# Altium footprint library DrPCB.PcbLib: 910 footprints (part 5 of 57)
Each footprint in its own frame and in the unit in brackets; x right, y up, seen from the top. Pads: shape width x height; smd on the part's side, far side on the other; paste and mask are expansions set on the pad; w line width, h text height; cw(c..) or ccw(c..) is an arc to the next point about the centre after c.
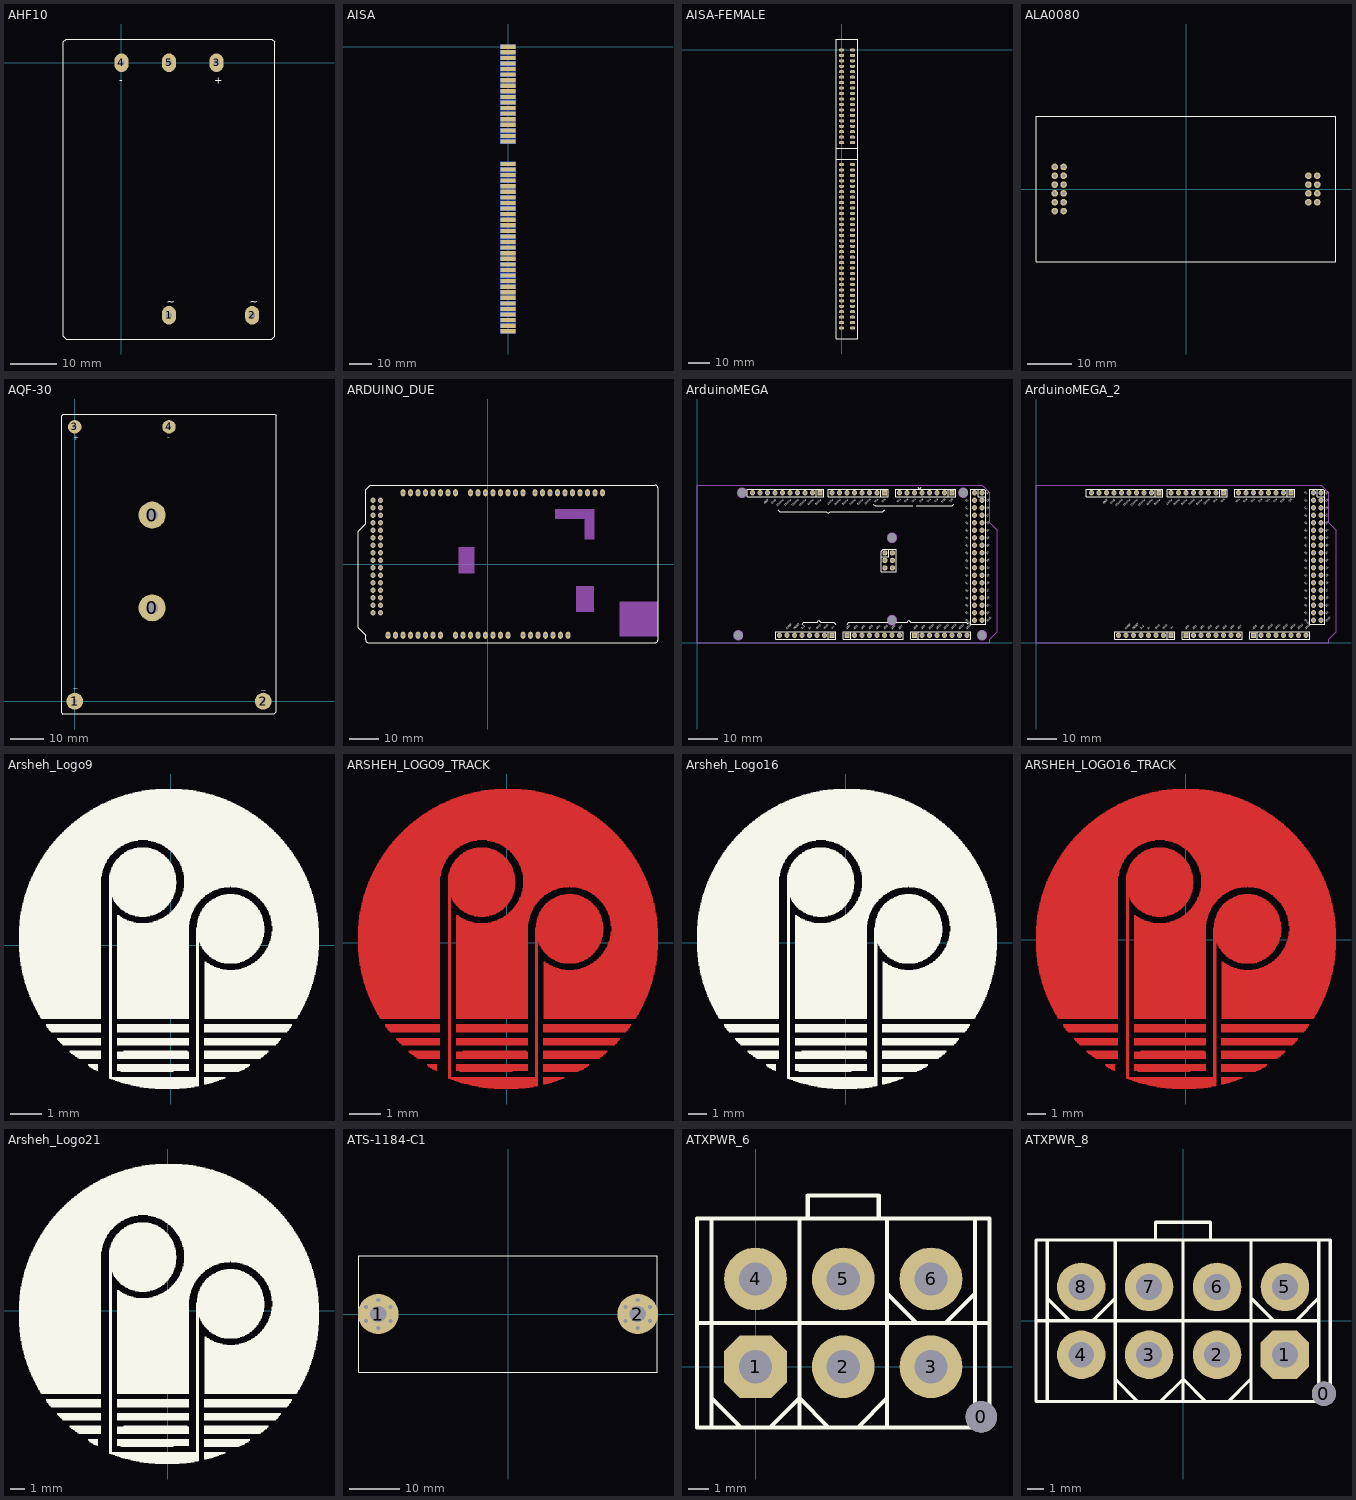
[diagram p4: the footprints below, top view; thin cyan lines are the x and y axes]

## AHF10 [mm]
pads (5):
  oval 3x4 hole 1.254: 1(10.16,-53.975) 2(27.94,-53.975) 3(20.32,0) 4(0,0) 5(10.16,0)
Top Overlay:
  lines w0.254: -12.446,-58.42 -11.811,-59.055 32.131,-59.055 32.766,-58.42 32.766,4.445 32.131,5.08 -11.811,5.08 -12.446,4.445 -12.446,-58.42
  text "~" at 27.432,-51.816 h1.52
  text "~" at 9.652,-51.816 h1.52
  text "+" at 19.812,-4.445 h1.52
  text "-" at -0.508,-4.445 h1.52

## AISA [mm]
pads (98):
  rect 7x1.9 smd far side: 1(-0.04,0.077) 3(-0.04,-2.463) 5(-0.04,-5.003) 7(-0.04,-7.543) 9(-0.04,-10.083) 11(-0.04,-12.623) 13(-0.04,-15.163) 15(-0.04,-17.703) 17(-0.04,-20.243) 19(-0.04,-22.783) 21(-0.04,-25.323) 23(-0.04,-27.863) 25(-0.04,-30.403) 27(-0.04,-32.943) 29(-0.04,-35.483) 31(-0.04,-38.023) 33(-0.04,-40.563) 35(-0.04,-43.103) 37(-0.04,-53.263) 39(-0.033,-55.799) 41(-0.033,-58.339) 43(-0.033,-60.879) 45(-0.033,-63.419) 47(-0.033,-65.959) 49(-0.033,-68.499) 51(-0.033,-71.039) 53(-0.033,-73.579) 55(-0.033,-76.119) 57(-0.033,-78.659) 59(-0.033,-81.199) 61(-0.033,-83.739) 63(-0.033,-86.279) 65(-0.033,-88.819) 67(-0.033,-91.359) 69(-0.033,-93.899) 71(-0.033,-96.439) 73(-0.033,-98.979) 75(-0.033,-101.519) 77(-0.033,-104.059) 79(-0.033,-106.599) 81(-0.033,-109.139) 83(-0.033,-111.679) 85(-0.033,-114.219) 87(-0.033,-116.759) 89(-0.033,-119.299) 91(-0.033,-121.839) 93(-0.033,-124.379) 95(-0.033,-126.919) 97(-0.033,-129.459)
  rect 7x1.9 smd: 2(-0.043,0.089) 4(-0.043,-2.451) 6(-0.043,-4.991) 8(-0.043,-7.531) 10(-0.043,-10.071) 12(-0.043,-12.611) 14(-0.043,-15.151) 16(-0.043,-17.691) 18(-0.043,-20.231) 20(-0.043,-22.771) 22(-0.043,-25.311) 24(-0.043,-27.851) 26(-0.043,-30.391) 28(-0.043,-32.931) 30(-0.043,-35.471) 32(-0.043,-38.011) 34(-0.043,-40.551) 36(-0.043,-43.091) 38(-0.034,-53.264) 40(-0.034,-55.804) 42(-0.034,-58.344) 44(-0.034,-60.884) 46(-0.034,-63.424) 48(-0.034,-65.964) 50(-0.034,-68.504) 52(-0.034,-71.044) 54(-0.034,-73.584) 56(-0.034,-76.124) 58(-0.034,-78.664) 60(-0.034,-81.204) 62(-0.034,-83.744) 64(-0.034,-86.284) 66(-0.034,-88.824) 68(-0.034,-91.364) 70(-0.034,-93.904) 72(-0.034,-96.444) 74(-0.034,-98.984) 76(-0.034,-101.524) 78(-0.034,-104.064) 80(-0.034,-106.604) 82(-0.034,-109.144) 84(-0.034,-111.684) 86(-0.034,-114.224) 88(-0.034,-116.764) 90(-0.034,-119.304) 92(-0.034,-121.844) 94(-0.034,-124.384) 96(-0.034,-126.924) 98(-0.034,-129.464)

## AISA-FEMALE [mm]
pads (98):
  oval 2.5x1.4 hole 1: 1(5.08,0) 2(0,0) 3(5.08,-2.54) 4(0,-2.54) 5(5.08,-5.08) 6(0,-5.08) 7(5.08,-7.62) 8(0,-7.62) 9(5.08,-10.16) 10(0,-10.16) 11(5.08,-12.7) 12(0,-12.7) 13(5.08,-15.24) 14(0,-15.24) 15(5.08,-17.78) 16(0,-17.78) 17(5.08,-20.32) 18(0,-20.32) 19(5.08,-22.86) 20(0,-22.86) 21(5.08,-25.4) 22(0,-25.4) 23(5.08,-27.94) 24(0,-27.94) 25(5.08,-30.48) 26(0,-30.48) 27(5.08,-33.02) 28(0,-33.02) 29(5.08,-35.56) 30(0,-35.56) 31(5.08,-38.1) 32(0,-38.1) 33(5.08,-40.64) 34(0,-40.64) 35(5.08,-43.18) 36(0,-43.18) 37(5.08,-53.34) 38(0,-53.34) 39(5.08,-55.88) 40(0,-55.88) 41(5.08,-58.42) 42(0,-58.42) 43(5.08,-60.96) 44(0,-60.96) 45(5.08,-63.5) 46(0,-63.5) 47(5.08,-66.04) 48(0,-66.04) 49(5.08,-68.58) 50(0,-68.58) 51(5.08,-71.12) 52(0,-71.12) 53(5.08,-73.66) 54(0,-73.66) 55(5.08,-76.2) 56(0,-76.2) 57(5.08,-78.74) 58(0,-78.74) 59(5.08,-81.28) 60(0,-81.28) 61(5.08,-83.82) 62(0,-83.82) 63(5.08,-86.36) 64(0,-86.36) 65(5.08,-88.9) 66(0,-88.9) 67(5.08,-91.44) 68(0,-91.44) 69(5.08,-93.98) 70(0,-93.98) 71(5.08,-96.52) 72(0,-96.52) 73(5.08,-99.06) 74(0,-99.06) 75(5.08,-101.6) 76(0,-101.6) 77(5.08,-104.14) 78(0,-104.14) 79(5.08,-106.68) 80(0,-106.68) 81(5.08,-109.22) 82(0,-109.22) 83(5.08,-111.76) 84(0,-111.76) 85(5.08,-114.3) 86(0,-114.3) 87(5.08,-116.84) 88(0,-116.84) 89(5.08,-119.38) 90(0,-119.38) 91(5.08,-121.92) 92(0,-121.92) 93(5.08,-124.46) 94(0,-124.46) 95(5.08,-127) 96(0,-127) 97(5.08,-129.54) 98(0,-129.54)
Top Overlay:
  lines w0.254: -2.54,-50.8 7.62,-50.8 ; -2.54,-45.72 7.62,-45.72 ; -2.54,-134.62 7.62,-134.62 7.62,5.08 -2.54,5.08 -2.54,-134.62

## ALA0080 [mm]
pads (20):
  round 1.5 hole 0.8: 0(27.75,1) 1(-27.75,-1) 1(-27.75,1) 2(-29.75,-1) 2(-29.75,1) 2(29.75,-1) 2(29.75,1) 3(29.75,-3) 4(27.75,-3) 5(29.75,3) 6(27.75,3) 7(-27.75,-5) 7(-27.75,-3) 8(-29.75,-5) 8(-29.75,-3) 9(-27.75,3) 9(-27.75,5) 10(-29.75,3) 10(-29.75,5) 11(27.75,-1)
Top Overlay:
  lines w0.254: -34,-16.5 -34,16.5 34,16.5 34,-16.5 -34,-16.5

## AQF-30 [mm]
pads (6):
  round 8 hole 3.6: 0(22.94,27.65) 0(22.94,55.15)
  round 5 hole 1.4: 1(0,0) 2(55.88,0)
  round 4 hole 1.4: 3(0,81.3) 4(27.94,81.3)
Top Overlay:
  lines w0.254: -3.556,-3.8 59.09,-3.8 59.715,-3.175 59.715,84.734 59.36,85.09 ; -3.531,-3.81 -3.835,-3.505 -3.835,84.633 -3.368,85.1 59.334,85.1
  text "~" at 55.143,2.515 h1.52
  text "~" at -0.639,3.015 h1.52
  text "+" at -0.457,77.267 h1.52
  text "-" at 27.407,77.419 h1.52

## ARDUINO_DUE [mm]
pads (81):
  oval 1.6x2.4 hole 1: 1(27.178,-24.13) 2(24.638,-24.13) 3(22.098,-24.13) 4(19.558,-24.13) 5(17.018,-24.13) 6(14.478,-24.13) 7(11.938,-24.13) 8(6.858,-24.13) 9(4.318,-24.13) 10(1.778,-24.13) 11(-0.762,-24.13) 12(-3.302,-24.13) 13(-5.842,-24.13) 14(-8.382,-24.13) 15(-10.922,-24.13) 16(-16.002,-24.13) 17(-18.542,-24.13) 18(-21.082,-24.13) 19(-23.622,-24.13) 20(-26.162,-24.13) 21(-28.702,-24.13) 22(-31.242,-24.13) 23(-33.782,-24.13) 56(-28.702,24.13) 57(-26.162,24.13) 58(-23.622,24.13) 59(-21.082,24.13) 60(-18.542,24.13) 61(-16.002,24.13) 62(-13.462,24.13) 63(-10.922,24.13) 64(-5.842,24.13) 65(-3.302,24.13) 66(-0.762,24.13) 67(1.778,24.13) 68(4.318,24.13) 69(6.858,24.13) 70(9.398,24.13) 71(11.938,24.13) 72(16.002,24.13) 73(18.542,24.13) 74(21.082,24.13) 75(23.622,24.13) 76(26.162,24.13) 77(28.702,24.13) 78(31.242,24.13) 79(33.782,24.13) 80(36.322,24.13) 81(38.862,24.13)
  round 1.8 hole 1: 24(-38.862,-16.51) 25(-36.322,-16.51) 26(-38.862,-13.97) 27(-36.322,-13.97) 28(-38.862,-11.43) 29(-36.322,-11.43) 30(-38.862,-8.89) 31(-36.322,-8.89) 32(-38.862,-6.35) 33(-36.322,-6.35) 34(-38.862,-3.81) 35(-36.322,-3.81) 36(-38.862,-1.27) 37(-36.322,-1.27) 38(-38.862,1.27) 39(-36.322,1.27) 40(-38.862,3.81) 41(-36.322,3.81) 42(-38.862,6.35) 43(-36.322,6.35) 44(-38.862,8.89) 45(-36.322,8.89) 46(-38.862,11.43) 47(-36.322,11.43) 48(-38.862,13.97) 49(-36.322,13.97) 50(-38.862,16.51) 51(-36.322,16.51) 52(-38.862,19.05) 53(-36.322,19.05) 54(-38.862,21.59) 55(-36.322,21.59)
Top Overlay:
  lines w0.254: -43.942,-21.59 -43.942,11.176 -41.402,13.716 -41.402,25.146 -39.878,26.67 56.658,26.67 cw(c56.658,25.67) 57.658,25.67 57.658,-25.67 cw(c56.658,-25.67) 56.658,-26.67 -40.402,-26.67 cw(c-40.402,-25.67) -41.402,-25.67 -41.402,-24.13 -43.942,-21.59
Mechanical 1:
  rectangle: -9.923,-3.175 -4.462,5.715
  rectangle: 32.749,8.255 36.178,15.494
  rectangle: 22.843,15.24 36.178,18.669
  rectangle: 29.828,-16.256 35.924,-7.366
  rectangle: 44.687,-24.511 57.641,-12.7

## ArduinoMEGA [mm]
pads (98):
  round 1.6 hole 3.2: 0(13.97,2.54) 0(15.24,50.8) 0(66.04,7.62) 0(66.04,35.56) 0(90.17,50.8) 0(96.52,2.54)
  round 1.8 hole 0.9: 1(27.94,2.54) 2(30.48,2.54) 3(33.02,2.54) 4(35.56,2.54) 5(38.1,2.54) 6(40.64,2.54) 7(43.18,2.54) 10(53.34,2.54) 11(55.88,2.54) 12(58.42,2.54) 13(60.96,2.54) 14(63.5,2.54) 15(66.04,2.54) 16(68.58,2.54) 18(76.2,2.54) 19(78.74,2.54) 20(81.28,2.54) 21(83.82,2.54) 22(86.36,2.54) 23(88.9,2.54) 24(91.44,2.54) 25(93.98,7.62) 26(96.52,7.62) 27(93.98,10.16) 28(96.52,10.16) 29(93.98,12.7) 30(96.52,12.7) 31(93.98,15.24) 32(96.52,15.24) 33(93.98,17.78) 34(96.52,17.78) 35(93.98,20.32) 36(96.52,20.32) 37(93.98,22.86) 38(96.52,22.86) 39(93.98,25.4) 40(96.52,25.4) 41(93.98,27.94) 42(96.52,27.94) 43(93.98,30.48) 44(96.52,30.48) 45(93.98,33.02) 46(96.52,33.02) 47(93.98,35.56) 48(96.52,35.56) 49(93.98,38.1) 50(96.52,38.1) 51(93.98,40.64) 52(96.52,40.64) 53(93.98,43.18) 54(96.52,43.18) 55(93.98,45.72) 56(96.52,45.72) 57(93.98,48.26) 58(96.52,48.26) 59(93.98,50.8) 60(96.52,50.8) 62(83.82,50.8) 63(81.28,50.8) 64(78.74,50.8) 65(76.2,50.8) 66(73.66,50.8) 67(71.12,50.8) 68(68.58,50.8) 70(60.96,50.8) 71(58.42,50.8) 72(55.88,50.8) 73(53.34,50.8) 74(50.8,50.8) 75(48.26,50.8) 76(45.72,50.8) 78(39.116,50.8) 79(36.576,50.8) 80(34.036,50.8) 81(31.496,50.8) 82(28.956,50.8) 83(26.416,50.8) 84(23.876,50.8) 85(21.336,50.8) 86(18.796,50.8) 87(63.64,30.43) 88(66.18,30.43) 89(63.64,27.89) 90(66.18,27.89) 91(63.64,25.35) 92(66.18,25.35)
  rect 1.8x1.8 hole 0.9: 8(45.72,2.54) 9(50.8,2.54) 17(73.66,2.54) 61(86.36,50.8) 69(63.5,50.8) 77(41.656,50.8)
Top Overlay:
  lines w0.254: 27.305,45.085 27.94,44.45 43.815,44.45 44.45,43.815 45.085,44.45 62.865,44.45 63.5,45.085 ; 35.56,6.35 36.195,6.985 40.64,6.985 41.275,7.62 41.91,6.985 46.355,6.985 46.99,6.35 ; 40.386,49.53 40.386,52.07 ; 50.8,6.35 51.435,6.985 71.12,6.985 71.755,7.62 72.39,6.985 91.26,6.985 91.763,6.483 ; 52.07,1.27 52.07,3.81 ; 59.69,46.99 60.325,46.355 73.025,46.355 ; 62.23,49.53 62.23,52.07 ; 62.37,29.16 64.91,29.16 64.91,31.7 ; 74.295,46.355 86.36,46.355 86.995,46.99 ; 74.676,52.705 75.311,52.07 75.946,52.705 ; 74.93,1.27 74.93,3.81 ; 85.09,49.53 85.09,52.07 ; 95.25,52.07 95.25,49.53 97.79,49.53 ; 44.45,1.27 44.45,3.81 ; 44.45,1.27 26.67,1.27 26.67,3.81 44.45,3.81 ; 44.45,1.27 46.99,1.27 46.99,2.54 46.99,3.81 44.45,3.81 ; 17.018,49.53 42.926,49.53 42.926,52.07 17.018,52.07 17.018,49.53 ; 44.45,49.53 64.77,49.53 64.77,52.07 44.45,52.07 44.45,49.53 ; 49.53,1.27 49.53,3.81 69.85,3.81 69.85,1.27 49.53,1.27 ; 62.37,24.08 67.45,24.08 67.45,31.7 63.005,31.7 62.37,31.065 62.37,24.08 ; 67.31,49.53 87.63,49.53 87.63,52.07 67.31,52.07 67.31,49.53 ; 72.39,1.27 72.39,3.81 92.71,3.81 92.71,1.27 72.39,1.27 ; 92.71,6.35 92.71,52.07 97.155,52.07 97.79,51.435 97.79,6.35 92.71,6.35
  text "IOREF" at 30.48,4.445 h0.51
  text "RESET" at 33.02,4.445 h0.51
  text "3v3" at 35.56,4.445 h0.51
  text "5v" at 38.1,4.445 h0.51
  text "GND" at 40.64,4.445 h0.51
  text "GND" at 43.18,4.445 h0.51
  text "Vin" at 45.72,4.445 h0.51
  text "AD0" at 50.8,4.445 h0.51
  text "AD1" at 53.34,4.445 h0.51
  text "AD2" at 55.88,4.445 h0.51
  text "AD3" at 58.42,4.445 h0.51
  text "AD4" at 60.96,4.445 h0.51
  text "AD5" at 63.5,4.445 h0.51
  text "AD6" at 66.04,4.445 h0.51
  text "AD7" at 68.58,4.445 h0.51
  text "AD8" at 73.66,4.445 h0.51
  text "AD9" at 76.2,4.445 h0.51
  text "AD10" at 78.74,4.445 h0.51
  text "AD11" at 81.28,4.445 h0.51
  text "AD12" at 83.82,4.445 h0.51
  text "AD13" at 86.36,4.445 h0.51
  text "AD14" at 88.9,4.445 h0.51
  text "AD15" at 91.44,4.445 h0.51
  text "RX0" at 63.5,48.895 h0.51
  text "SCL" at 86.36,48.895 h0.51
  text "5V" at 90.805,50.8 h0.51
  text "22" at 90.805,48.26 h0.51
  text "24" at 90.805,45.72 h0.51
  text "26" at 90.805,43.18 h0.51
  text "28" at 90.805,40.64 h0.51
  text "30" at 90.805,38.1 h0.51
  text "32" at 90.805,35.56 h0.51
  text "34" at 90.805,33.02 h0.51
  text "36" at 90.805,30.48 h0.51
  text "38" at 90.805,27.94 h0.51
  text "40" at 90.805,25.4 h0.51
  text "42" at 90.805,22.86 h0.51
  text "44" at 90.805,20.32 h0.51
  text "46" at 90.805,17.78 h0.51
  text "48" at 90.805,15.24 h0.51
  text "52" at 90.805,10.16 h0.51
  text "GND" at 90.805,7.62 h0.51
  text "50" at 90.805,12.7 h0.51
  text "5V" at 98.425,50.165 h0.51
  text "23" at 98.425,47.625 h0.51
  text "25" at 98.425,45.085 h0.51
  text "27" at 98.425,42.545 h0.51
  text "29" at 98.425,40.005 h0.51
  text "31" at 98.425,37.465 h0.51
  text "33" at 98.425,34.925 h0.51
  text "35" at 98.425,32.385 h0.51
  text "37" at 98.425,29.845 h0.51
  text "39" at 98.425,27.305 h0.51
  text "41" at 98.425,24.765 h0.51
  text "43" at 98.425,22.225 h0.51
  text "45" at 98.425,19.685 h0.51
  text "47" at 98.425,17.145 h0.51
  text "49" at 98.425,14.605 h0.51
  text "51" at 98.425,12.065 h0.51
  text "53" at 98.425,9.525 h0.51
  text "GND" at 98.425,6.985 h0.51
  text "SDA" at 83.82,48.895 h0.51
  text "RX1" at 81.28,48.895 h0.51
  text "TX1" at 78.74,48.895 h0.51
  text "RX2" at 76.2,48.895 h0.51
  text "TX2" at 73.66,48.895 h0.51
  text "RX3" at 71.12,48.895 h0.51
  text "TX3" at 68.58,48.895 h0.51
  text "TX0" at 60.96,48.895 h0.51
  text "PWM2" at 58.42,48.895 h0.51
  text "PWM3" at 55.88,48.715 h0.51
  text "PWM4" at 53.34,48.715 h0.51
  text "PWM5" at 50.8,48.715 h0.51
  text "PWM6" at 48.26,48.715 h0.51
  text "PWM7" at 45.72,48.715 h0.51
  text "PWM8" at 41.656,48.768 h0.51
  text "PWM9" at 39.116,48.768 h0.51
  text "PWM10" at 36.576,48.768 h0.51
  text "PWM11" at 34.036,48.768 h0.51
  text "PWM12" at 31.496,48.768 h0.51
  text "PWM13" at 28.956,48.768 h0.51
  text "GND" at 26.416,48.768 h0.51
  text "AREF" at 23.876,48.768 h0.51
Mechanical 1:
  circle w0.127: c96.52,2.54 r1.6
  circle w0.127: c90.17,50.8 r1.6
  circle w0.127: c66.04,35.56 r1.6
  circle w0.127: c13.97,2.54 r1.6
  circle w0.127: c66.04,7.62 r1.6
  circle w0.127: c15.24,50.8 r1.6
  lines w0.127: 0,0 0,53.34 96.52,53.34 99.06,50.8 99.06,40.64 101.6,38.1 101.6,3.81 99.06,1.27 99.06,0 0,0
3D body "SIL_Socket08_.stp": height 8.5, standoff -14.85, extent 67.31,49.53 87.63,52.07
3D body "SIL_Socket08_.stp": height 8.5, standoff -14.85, extent 22.606,49.53 42.926,52.07
3D body "SIL_Socket36.stp": height 8.5, standoff -14.85, extent 92.71,6.35 97.79,52.07
3D body "SIL_Socket08_.stp": height 8.5, standoff -14.85, extent 44.45,49.53 64.77,52.07
3D body "SIL_Socket06.stp": height 8.5, standoff -14.85, extent 31.75,1.27 46.99,3.81
3D body "ICSP.stp": height 12.31, standoff -2.69, extent 62.37,24.08 67.45,31.7
3D body "SIL_Socket08_.stp": height 8.5, standoff -14.85, extent 49.53,1.27 69.85,3.81
3D body "SIL_Socket08_.stp": height 8.5, standoff -14.85, extent 72.39,1.27 92.71,3.81

## ArduinoMEGA_2 [mm]
pads (86):
  round 1.8 hole 0.9: 1(27.94,2.54) 2(30.48,2.54) 3(33.02,2.54) 4(35.56,2.54) 5(38.1,2.54) 6(40.64,2.54) 7(43.18,2.54) 10(53.34,2.54) 11(55.88,2.54) 12(58.42,2.54) 13(60.96,2.54) 14(63.5,2.54) 15(66.04,2.54) 16(68.58,2.54) 18(76.2,2.54) 19(78.74,2.54) 20(81.28,2.54) 21(83.82,2.54) 22(86.36,2.54) 23(88.9,2.54) 24(91.44,2.54) 25(93.98,7.62) 26(96.52,7.62) 27(93.98,10.16) 28(96.52,10.16) 29(93.98,12.7) 30(96.52,12.7) 31(93.98,15.24) 32(96.52,15.24) 33(93.98,17.78) 34(96.52,17.78) 35(93.98,20.32) 36(96.52,20.32) 37(93.98,22.86) 38(96.52,22.86) 39(93.98,25.4) 40(96.52,25.4) 41(93.98,27.94) 42(96.52,27.94) 43(93.98,30.48) 44(96.52,30.48) 45(93.98,33.02) 46(96.52,33.02) 47(93.98,35.56) 48(96.52,35.56) 49(93.98,38.1) 50(96.52,38.1) 51(93.98,40.64) 52(96.52,40.64) 53(93.98,43.18) 54(96.52,43.18) 55(93.98,45.72) 56(96.52,45.72) 57(93.98,48.26) 58(96.52,48.26) 59(93.98,50.8) 60(96.52,50.8) 62(83.82,50.8) 63(81.28,50.8) 64(78.74,50.8) 65(76.2,50.8) 66(73.66,50.8) 67(71.12,50.8) 68(68.58,50.8) 70(60.96,50.8) 71(58.42,50.8) 72(55.88,50.8) 73(53.34,50.8) 74(50.8,50.8) 75(48.26,50.8) 76(45.72,50.8) 78(39.116,50.8) 79(36.576,50.8) 80(34.036,50.8) 81(31.496,50.8) 82(28.956,50.8) 83(26.416,50.8) 84(23.876,50.8) 85(21.336,50.8) 86(18.796,50.8)
  rect 1.8x1.8 hole 0.9: 8(45.72,2.54) 9(50.8,2.54) 17(73.66,2.54) 61(86.36,50.8) 69(63.5,50.8) 77(41.656,50.8)
Top Overlay:
  lines w0.254: 40.386,49.53 40.386,52.07 ; 52.07,1.27 52.07,3.81 ; 62.23,49.53 62.23,52.07 ; 74.93,1.27 74.93,3.81 ; 85.09,49.53 85.09,52.07 ; 95.25,52.07 95.25,49.53 97.79,49.53 ; 44.45,1.27 44.45,3.81 ; 44.45,1.27 26.67,1.27 26.67,3.81 44.45,3.81 ; 44.45,1.27 46.99,1.27 46.99,2.54 46.99,3.81 44.45,3.81 ; 17.018,49.53 42.926,49.53 42.926,52.07 17.018,52.07 17.018,49.53 ; 44.45,49.53 64.77,49.53 64.77,52.07 44.45,52.07 44.45,49.53 ; 49.53,1.27 49.53,3.81 69.85,3.81 69.85,1.27 49.53,1.27 ; 67.31,49.53 87.63,49.53 87.63,52.07 67.31,52.07 67.31,49.53 ; 72.39,1.27 72.39,3.81 92.71,3.81 92.71,1.27 72.39,1.27 ; 92.71,6.35 92.71,52.07 97.155,52.07 97.79,51.435 97.79,6.35 92.71,6.35
  text "IOREF" at 30.48,4.445 h0.51
  text "RESET" at 33.02,4.445 h0.51
  text "3v3" at 35.56,4.445 h0.51
  text "5v" at 38.1,4.445 h0.51
  text "GND" at 40.64,4.445 h0.51
  text "GND" at 43.18,4.445 h0.51
  text "Vin" at 45.72,4.445 h0.51
  text "AD0" at 50.8,4.445 h0.51
  text "AD1" at 53.34,4.445 h0.51
  text "AD2" at 55.88,4.445 h0.51
  text "AD3" at 58.42,4.445 h0.51
  text "AD4" at 60.96,4.445 h0.51
  text "AD5" at 63.5,4.445 h0.51
  text "AD6" at 66.04,4.445 h0.51
  text "AD7" at 68.58,4.445 h0.51
  text "AD8" at 73.66,4.445 h0.51
  text "AD9" at 76.2,4.445 h0.51
  text "AD10" at 78.74,4.445 h0.51
  text "AD11" at 81.28,4.445 h0.51
  text "AD12" at 83.82,4.445 h0.51
  text "AD13" at 86.36,4.445 h0.51
  text "AD14" at 88.9,4.445 h0.51
  text "AD15" at 91.44,4.445 h0.51
  text "RX0" at 63.5,48.895 h0.51
  text "SCL" at 86.36,48.895 h0.51
  text "5V" at 90.805,50.8 h0.51
  text "22" at 90.805,48.26 h0.51
  text "24" at 90.805,45.72 h0.51
  text "26" at 90.805,43.18 h0.51
  text "28" at 90.805,40.64 h0.51
  text "30" at 90.805,38.1 h0.51
  text "32" at 90.805,35.56 h0.51
  text "34" at 90.805,33.02 h0.51
  text "36" at 90.805,30.48 h0.51
  text "38" at 90.805,27.94 h0.51
  text "40" at 90.805,25.4 h0.51
  text "42" at 90.805,22.86 h0.51
  text "44" at 90.805,20.32 h0.51
  text "46" at 90.805,17.78 h0.51
  text "48" at 90.805,15.24 h0.51
  text "52" at 90.805,10.16 h0.51
  text "GND" at 90.805,7.62 h0.51
  text "50" at 90.805,12.7 h0.51
  text "5V" at 98.425,50.165 h0.51
  text "23" at 98.425,47.625 h0.51
  text "25" at 98.425,45.085 h0.51
  text "27" at 98.425,42.545 h0.51
  text "29" at 98.425,40.005 h0.51
  text "31" at 98.425,37.465 h0.51
  text "33" at 98.425,34.925 h0.51
  text "35" at 98.425,32.385 h0.51
  text "37" at 98.425,29.845 h0.51
  text "39" at 98.425,27.305 h0.51
  text "41" at 98.425,24.765 h0.51
  text "43" at 98.425,22.225 h0.51
  text "45" at 98.425,19.685 h0.51
  text "47" at 98.425,17.145 h0.51
  text "49" at 98.425,14.605 h0.51
  text "51" at 98.425,12.065 h0.51
  text "53" at 98.425,9.525 h0.51
  text "GND" at 98.425,6.985 h0.51
  text "SDA" at 83.82,48.895 h0.51
  text "RX1" at 81.28,48.895 h0.51
  text "TX1" at 78.74,48.895 h0.51
  text "RX2" at 76.2,48.895 h0.51
  text "TX2" at 73.66,48.895 h0.51
  text "RX3" at 71.12,48.895 h0.51
  text "TX3" at 68.58,48.895 h0.51
  text "TX0" at 60.96,48.895 h0.51
  text "PWM2" at 58.42,48.895 h0.51
  text "PWM3" at 55.88,48.715 h0.51
  text "PWM4" at 53.34,48.715 h0.51
  text "PWM5" at 50.8,48.715 h0.51
  text "PWM6" at 48.26,48.715 h0.51
  text "PWM7" at 45.72,48.715 h0.51
  text "PWM8" at 41.656,48.768 h0.51
  text "PWM9" at 39.116,48.768 h0.51
  text "PWM10" at 36.576,48.768 h0.51
  text "PWM11" at 34.036,48.768 h0.51
  text "PWM12" at 31.496,48.768 h0.51
  text "PWM13" at 28.956,48.768 h0.51
  text "GND" at 26.416,48.768 h0.51
  text "AREF" at 23.876,48.768 h0.51
Mechanical 1:
  lines w0.127: 0,0 0,53.34 96.52,53.34 99.06,50.8 99.06,40.64 101.6,38.1 101.6,3.81 99.06,1.27 99.06,0 0,0
3D body "SIL_Socket08_.stp": height 8.5, standoff -14.85, extent 67.31,49.53 87.63,52.07
3D body "SIL_Socket08_.stp": height 8.5, standoff -14.85, extent 22.606,49.53 42.926,52.07
3D body "SIL_Socket36.stp": height 8.5, standoff -14.85, extent 92.71,6.35 97.79,52.07
3D body "SIL_Socket08_.stp": height 8.5, standoff -14.85, extent 44.45,49.53 64.77,52.07
3D body "SIL_Socket06.stp": height 8.5, standoff -14.85, extent 31.75,1.27 46.99,3.81
3D body "SIL_Socket08_.stp": height 8.5, standoff -14.85, extent 49.53,1.27 69.85,3.81
3D body "SIL_Socket08_.stp": height 8.5, standoff -14.85, extent 72.39,1.27 92.71,3.81

## Arsheh_Logo9 [mm]
Top Overlay:
  drawing of 15 lines, arcs and shapes, not listed

## ARSHEH_LOGO9_TRACK [mm]
Top Layer:
  drawing of 15 lines, arcs and shapes, not listed

## Arsheh_Logo16 [mm]
Top Overlay:
  drawing of 15 lines, arcs and shapes, not listed

## ARSHEH_LOGO16_TRACK [mm]
Top Layer:
  drawing of 15 lines, arcs and shapes, not listed

## Arsheh_Logo21 [mm]
Top Overlay:
  drawing of 15 lines, arcs and shapes, not listed

## ATS-1184-C1 [mm]
pads (2):
  round 8 hole 3.2: 1(-25.65,0) 2(25.65,0)
via 23.23,1.404 diameter 0.8 hole 0.8
via 23.224,-1.394 diameter 0.8 hole 0.8
via 28.076,-1.378 diameter 0.8 hole 0.8
via 28.07,1.397 diameter 0.8 hole 0.8
via 25.65,-2.8 diameter 0.8 hole 0.8
via 25.65,2.8 diameter 0.8 hole 0.8
via -28.07,1.404 diameter 0.8 hole 0.8
via -28.076,-1.394 diameter 0.8 hole 0.8
via -23.224,-1.378 diameter 0.8 hole 0.8
via -23.23,1.397 diameter 0.8 hole 0.8
via -25.65,-2.8 diameter 0.8 hole 0.8
via -25.65,2.8 diameter 0.8 hole 0.8
Top Overlay:
  lines w0.2: -29.5,-11.5 -29.5,11.5 29.5,11.5 29.5,-11.5 -29.5,-11.5
3D body "ATS-1184-C1-R0.STEP": height 12, standoff 1.5, extent -29.5,-11.5 29.5,11.5

## ATXPWR_6 [mm] "Connector; ATX Power; 6 Position, TE 4-1775099-1"
pads (7):
  round 1.5 hole 1.5: 0(10.808,-2.4)
  oct 3x3 hole 1.6: 1(0,0)
  round 3 hole 1.6: 2(4.2,0) 3(8.4,0) 4(0,4.2) 5(4.2,4.2) 6(8.4,4.2)
Top Overlay:
  lines w0.2: -2.8,2.1 11.2,2.1 ; -2.1,-2.9 -2.1,7.1 ; -2.1,-1.5 -0.7,-2.9 ; 0.7,-2.9 2.1,-1.5 3.5,-2.9 ; 2.1,-2.9 2.1,7.1 ; 2.5,7.1 2.5,8.2 5.9,8.2 5.9,7.1 ; 4.9,-2.9 6.3,-1.5 ; 6.3,-2.9 6.3,7.1 ; 6.3,3.5 7.7,2.1 ; 9.1,2.1 10.5,3.5 ; 10.5,-2.9 10.5,7.1 ; -2.8,-2.9 11.2,-2.9 11.2,7.1 -2.8,7.1 -2.8,-2.9
3D body "4-1775099-1.stp": height 13, standoff -3, extent -2.65,-2.7 11.05,8.2

## ATXPWR_8 [mm] "Connector; ATX Power; 6 Position, TE 4-1775099-1"
pads (9):
  round 1.5 hole 1.5: 0(8.712,-4.508)
  oct 3x3 hole 1.6: 1(6.3,-2.1)
  round 3 hole 1.6: 2(2.1,-2.1) 3(-2.1,-2.1) 4(-6.3,-2.1) 5(6.3,2.1) 6(2.1,2.1) 7(-2.1,2.1) 8(-6.3,2.1)
Top Overlay:
  lines w0.2: -9.1,0 8.339,0 ; -8.4,-5 -8.4,5 ; -8.4,1.4 -7,0 ; -5.6,0 -4.2,1.4 ; -4.2,-5 -4.2,5 ; -4.2,-3.6 -2.8,-5 ; -1.7,5 -1.7,6.1 1.7,6.1 1.7,5 ; -1.4,-5 0,-3.6 1.4,-5 ; 0,-5 0,5 ; 2.8,-5 4.2,-3.6 ; 4.2,-5 4.2,5 ; 4.2,1.415 5.6,0.015 ; 7,0.015 8.4,1.415 ; 8.4,-4.985 8.4,4.953 ; 9.076,-5 -9.1,-5 -9.1,5 9.1,5 9.1,-4.985
3D body "4-1775099-2.stp": height 12.81, standoff -3.19, extent -9.129,-4.893 9.12,6.007